# Altium footprint library PART.PcbLib: 407 footprints (part 13 of 26)
Each footprint in its own frame and in the unit in brackets; x right, y up, seen from the top. Pads: shape width x height; smd on the part's side, far side on the other; paste and mask are expansions set on the pad; w line width, h text height; cw(c..) or ccw(c..) is an arc to the next point about the centre after c.
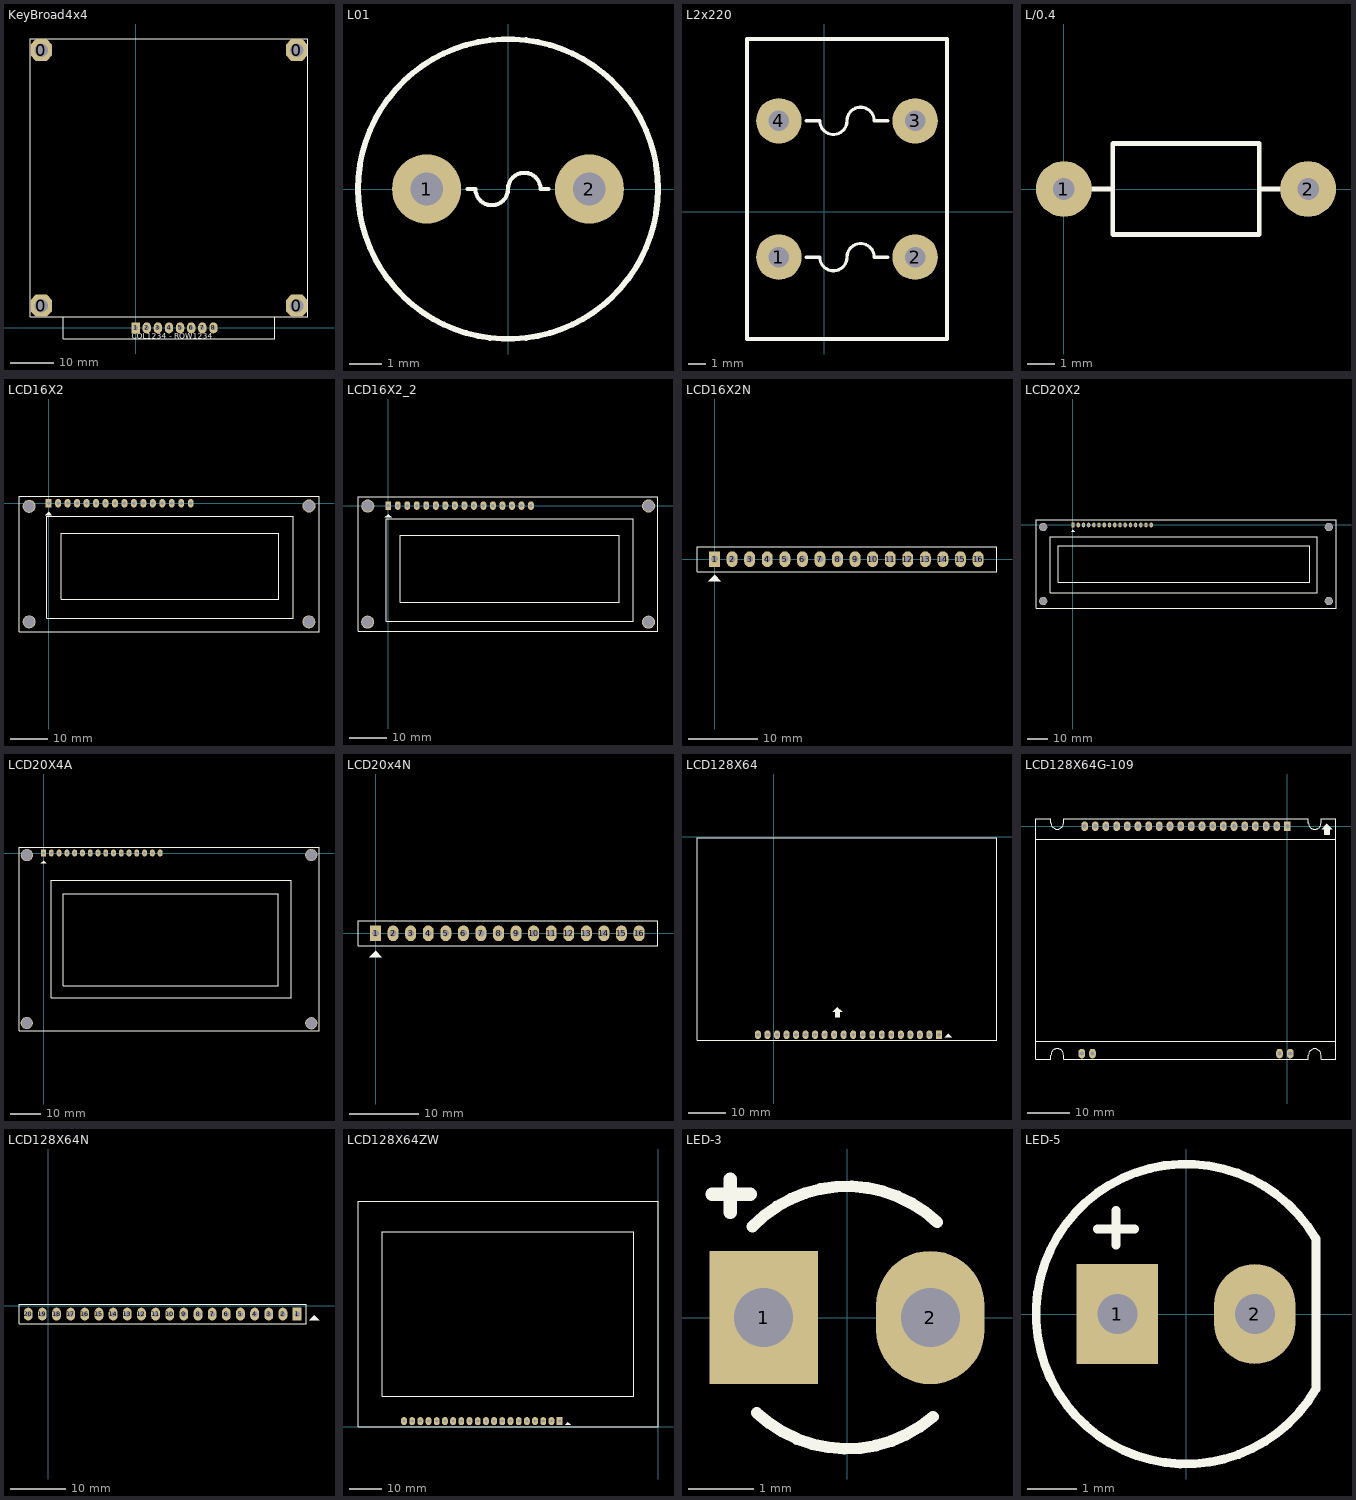
[diagram p12: the footprints below, top view; thin cyan lines are the x and y axes]

## KeyBroad4x4 [mm] "KeyBroad 4x4"
height 5.08
pads (12):
  oct 5x5 hole 3.048: 0(-21.59,5.08) 0(-21.59,63.5) 0(36.83,5.08) 0(36.83,63.5)
  rect 1.905x2.5 hole 1: 1(0,0)
  oval 1.905x2.5 hole 1: 2(2.54,0) 3(5.08,0) 4(7.62,0) 5(10.16,0) 6(12.7,0) 7(15.24,0) 8(17.78,0)
Top Overlay:
  lines w0.203: -16.51,2.54 -16.51,-2.515 -16.535,-2.54 31.75,-2.54 31.75,2.489 ; -24.13,2.54 39.37,2.54 39.37,66.04 -24.13,66.04 -24.13,2.54
  text "COL1234 - ROW1234" at -0.889,-2.464 h1.27

## L01 [mil] "Inductor"
pads (2):
  round 85 hole 40: 1(-100,0) 2(100,0)
Top Overlay:
  circle w7: c0,0 r184.39
  lines w5: -50,0 -40,0 ccw(c-20,0) 0,0 cw(c20,0) 40,0 50,0

## L2x220 [mil] "Loc 220"
pads (4):
  round 100 hole 45: 1(-100,-100) 2(200,-100) 3(200,200) 4(-100,200)
Top Overlay:
  lines w7: -10,-100 ccw(c20,-100) 50,-100 cw(c80,-100) 110,-100 ; -10,200 ccw(c20,200) 50,200 cw(c80,200) 110,200
  lines w8: -40,-100 -10,-100 ; -40,200 -10,200 ; 110,-100 140,-100 ; 110,200 140,200 ; -170,-280 270,-280 270,380 -170,380 -170,-280

## L/0.4 [mil] "Inductor , 2 Pin, L 350mil, W 150 mil"
height 150
pads (2):
  round 80 hole 31: 1(0,0) 2(350,0)
Top Overlay:
  lines w7: 70,0 40,0 70,0 ; 70,0 70,-65 280,-65 280,0 ; 70,0 70,65 280,65 280,0 ; 280,0 310,0 280,0

## LCD16X2 [mil] "LCD dipslay 16x2, 16 pin"
height 400
pads (20):
  rect 62x90 hole 36: 1(0,0)
  oval 62x90 hole 36: 2(100,0) 3(200,0) 4(300,0) 5(400,0) 6(500,0) 7(600,0) 8(700,0) 9(800,0) 10(900,0) 11(1000,0) 12(1100,0) 13(1200,0) 14(1300,0) 15(1400,0) 16(1500,0)
  round 137.8 hole 118.11: "Hole 0"(-206,-1252) "Hole 0"(-206,-33) "Hole 0"(2747,-1252) "Hole 0"(2748,-29)
Top Overlay:
  region: 0,-90 -35,-125 35,-125
  lines w7: -313,-1359 2854,-1359 2854,76 -313,76 -313,-1359 ; -19,-1215 2581,-1215 2581,-140 -19,-140 -19,-1215 ; 131,-1015 2431,-1015 2431,-315 131,-315 131,-1015
3D body: height 414, standoff -106, extent -314.65,-1360 2854.65,77.01

## LCD16X2_2 [mil] "LCD dipslay 16x2, 16 pin"
height 400
pads (20):
  rect 62x90 hole 36: 1(0,0)
  oval 62x90 hole 36: 2(100,0) 3(200,0) 4(300,0) 5(400,0) 6(500,0) 7(600,0) 8(700,0) 9(800,0) 10(900,0) 11(1000,0) 12(1100,0) 13(1200,0) 14(1300,0) 15(1400,0) 16(1500,0)
  round 137.8 hole 118.11: "Hole 0"(-217,-1225) "Hole 0"(-215,-5) "Hole 0"(2736,-1225) "Hole 0"(2736,-4)
Top Overlay:
  region: 0,-90 -35,-125 35,-125
  lines w7: -318,-1323 2836,-1323 2836,95 -318,95 -318,-1323 ; -23,-1214 2577,-1214 2577,-139 -23,-139 -23,-1214 ; 127,-1014 2427,-1014 2427,-314 127,-314 127,-1014
3D body: height 433.07, standoff -114.17, extent -315,-1321.32 2834.61,96

## LCD16X2N [mil] "LCD dipslay 16x2, 16 pin"
height 400
pads (16):
  rect 62x90 hole 39: 1(0,0)
  oval 62x90 hole 39: 2(100,0) 3(200,0) 4(300,0) 5(400,0) 6(500,0) 7(600,0) 8(700,0) 9(800,0) 10(900,0) 11(1000,0) 12(1100,0) 13(1200,0) 14(1300,0) 15(1400,0) 16(1500,0)
Top Overlay:
  region: 0,-90 -35,-125 35,-125
  lines w7: -100,-71 1608,-71 1608,70 -100,70 -100,-71

## LCD20X2 [mil] "LCD dipslay 20x2, 16 pin"
height 400
pads (20):
  rect 62x90 hole 36: 1(0,0)
  oval 62x90 hole 36: 2(100,0) 3(200,0) 4(300,0) 5(400,0) 6(500,0) 7(600,0) 8(700,0) 9(800,0) 10(900,0) 11(1000,0) 12(1100,0) 13(1200,0) 14(1300,0) 15(1400,0) 16(1500,0)
  round 157.48 hole 137.8: "Hole 0"(-570.87,-1456.69) "Hole 0"(-570.87,-39.37) "Hole 0"(4901.57,-1456.69) "Hole 0"(4901.57,-39.37)
Top Overlay:
  region: 0,-90 -35,-125 35,-125
  lines w7: -708.66,-1594.49 -708.66,100 5039.37,100 5039.37,-1594.49 -708.66,-1594.49 ; -436,-1300 -436,-225 4682,-225 4682,-1300 -436,-1300 ; -286,-1100 -286,-400 4532,-400 4532,-1100 -286,-1100

## LCD20X4A [mil] "LCD dipslay 20x4, 16 pin"
height 400
pads (20):
  rect 62x90 hole 39: 1(0,0)
  oval 62x90 hole 39: 2(100,0) 3(200,0) 4(300,0) 5(400,0) 6(500,0) 7(600,0) 8(700,0) 9(800,0) 10(900,0) 11(1000,0) 12(1100,0) 13(1200,0) 14(1300,0) 15(1400,0) 16(1500,0)
  round 157.48 hole 137.8: "Hole 0"(-216,-2188) "Hole 0"(-215,-27) "Hole 0"(3445,-2190) "Hole 0"(3445,-25)
Top Overlay:
  region: 0,-100 -35,-135 35,-135
  lines w7: -316,-2287 -316,74 3544,74 3544,-2287 -316,-2287 ; 102,-1863 102,-348 3189,-348 3189,-1863 102,-1863 ; 252,-1706 252,-523 3018,-523 3018,-1706 252,-1706
3D body: height 413.39, standoff 0, extent -314.27,-2288.21 3544,74

## LCD20x4N [mil] "LCD dipslay 20x4, 16 pin"
height 400
pads (16):
  rect 62x90 hole 39: 1(0,0)
  oval 62x90 hole 39: 2(100,0) 3(200,0) 4(300,0) 5(400,0) 6(500,0) 7(600,0) 8(700,0) 9(800,0) 10(900,0) 11(1000,0) 12(1100,0) 13(1200,0) 14(1300,0) 15(1400,0) 16(1500,0)
Top Overlay:
  region: 0,-100 -35,-135 35,-135
  lines w7: -100,-71 -100,70 1608,70 1608,-71 -100,-71

## LCD128X64 [mil] "LCD Graphic 128x64, 20 pin"
height 400
pads (20):
  rect 62x90 hole 39: 1(1735,-2080)
  oval 62x90 hole 39: 2(1635,-2080) 3(1535,-2080) 4(1435,-2080) 5(1335,-2080) 6(1235,-2080) 7(1135,-2080) 8(1035,-2080) 9(935,-2080) 10(835,-2080) 11(735,-2080) 12(635,-2080) 13(535,-2080) 14(435,-2080) 15(335,-2080) 16(235,-2080) 17(135,-2080) 18(35,-2080) 19(-65,-2080) 20(-165,-2080)
Top Overlay:
  region: 670,-1790 620,-1840 645,-1840 645,-1895 695,-1895 695,-1840 720,-1840
  region: 1832.5,-2072.5 1797.5,-2107.5 1867.5,-2107.5
  lines w8: -805,-2138 2345,-2138 2345,-12 -805,-12 -805,-2138
3D body: height 275.59, standoff -330.71, extent -804.61,-2137.98 2345,-12

## LCD128X64G-109 [mil] "LCD Graphic 128x64, 20 pin"
height 400
pads (24):
  oval 62x90 hole 39.37: 0(-1925.87,-2129.13) 0(-1825.87,-2129.13) 0(-74.13,-2129.13) 0(25.87,-2129.13) 2(-100,0) 3(-200,0) 4(-300,0) 5(-400,0) 6(-500,0) 7(-600,0) 8(-700,0) 9(-800,0) 10(-900,0) 11(-1000,0) 12(-1100,0) 13(-1200,0) 14(-1300,0) 15(-1400,0) 16(-1500,0) 17(-1600,0) 18(-1700,0) 19(-1800,0) 20(-1900,0)
  rect 62x90 hole 39.37: 1(0,0)
Top Overlay:
  region: 370,23.37 320,-26.63 345,-26.63 345,-81.63 395,-81.63 395,-26.63 420,-26.63
  lines w8: -2355,-2014.13 450,-2014.13 ; -2355,-124.13 450,-124.13 ; -2215,-2184.13 -2355,-2184.13 -2355,70.87 -2215,70.87 ; -2215,-2183.13 -2215,-2143.13 cw(c-2155.94,-2143.13) -2096.89,-2143.13 ; -2215,29.87 -2215,69.87 ; -2215,31.87 ccw(c-2155.94,31.87) -2096.89,31.87 ; -2097,-2143.13 -2097,-2183.13 -2095,-2183.13 ; -2097,29.87 -2097,69.87 -2095,69.87 ; -2095,-2184.13 195,-2184.13 197,-2184.13 197,-2144.13 ; -2095,70.87 195,70.87 ; 195,68.87 197,68.87 197,28.87 ; 196.89,-2144.13 cw(c255.94,-2144.13) 315,-2144.13 315,-2184.13 455,-2184.13 455,70.87 315,70.87 ; 196.89,30.87 ccw(c255.94,30.87) 315,30.87 ; 315,28.87 315,68.87
3D body: height 98.43, standoff 39.37, extent -2355,-2185 455,70
3D body: height 196.85, standoff 98.43, extent -2350,-2015 450,-125

## LCD128X64N [mil] "LCD Graphic 128x64, 20 pin"
height 400
pads (20):
  rect 62x90 hole 39: 1(1760,-60)
  oval 62x90 hole 39: 2(1660,-60) 3(1560,-60) 4(1460,-60) 5(1360,-60) 6(1260,-60) 7(1160,-60) 8(1060,-60) 9(960,-60) 10(860,-60) 11(760,-60) 12(660,-60) 13(560,-60) 14(460,-60) 15(360,-60) 16(260,-60) 17(160,-60) 18(60,-60) 19(-40,-60) 20(-140,-60)
Top Overlay:
  region: 1880,-70 1845,-105 1915,-105
  lines w7: -205,-130 -205,11 1825,11 1825,-130 -205,-130

## LCD128X64ZW [mm] "LCD Graphic 128x64, 20 pin"
height 10.16
pads (20):
  rect 1.8x2.5 hole 1: 1(-30.505,1.803)
  oval 1.8x2.5 hole 1: 2(-33.045,1.803) 3(-35.585,1.803) 4(-38.125,1.803) 5(-40.665,1.803) 6(-43.205,1.803) 7(-45.745,1.803) 8(-48.285,1.803) 9(-50.825,1.803) 10(-53.365,1.803) 11(-55.905,1.803) 12(-58.445,1.803) 13(-60.985,1.803) 14(-63.525,1.803) 15(-66.065,1.803) 16(-68.605,1.803) 17(-71.145,1.803) 18(-73.685,1.803) 19(-76.225,1.803) 20(-78.765,1.803)
Top Overlay:
  region: -27.953,1.486 -28.842,0.597 -27.064,0.597
  lines w0.203: -93.015,0 -0.015,0 -0.015,70 -93.015,70 -93.015,0 ; -85.522,9.5 -85.522,60.503 -7.518,60.503 -7.518,9.5 -85.522,9.5
3D body: height 7, standoff -8.4, extent -86.502,7.95 -6.502,61.95

## LED-3 [mil] "LED 2 PIN, 3ly Only colour"
height 300
pads (2):
  rect 65x80 hole 35.43: 1(-50,0)
  oval 65x80 hole 35.43: 2(50,0)
Top Overlay:
  lines w7.01: -56.66,54.67 cw(c0,0) 54.12,57.19 ; -54.15,-57.16 ccw(c0,0) 51.57,-59.5
  lines w8: -81,74 -58,74 ; -70,63 -70,83
3D body: height 255.91, standoff -78.74, extent -78.9,-74.61 58.9,75

## LED-5 [mil] "LED 2 PIN, 5 ly , Only colour, pin to pin 110mil"
height 300
pads (2):
  rect 65x80 hole 32: 1(-55,0)
  oval 65x80 hole 32: 2(55,0)
Top Overlay:
  lines w7: -71,68 -41,68 ; -56,55 -56,83 ; 103.51,60.71 ccw(c0,0) 103.94,-59.97 ; 104,-59 104,60